# Altium footprint library Dr.Xiong_20160818.PcbLib: 266 footprints (part 9 of 17)
Each footprint in its own frame and in the unit in brackets; x right, y up, seen from the top. Pads: shape width x height; smd on the part's side, far side on the other; paste and mask are expansions set on the pad; w line width, h text height; cw(c..) or ccw(c..) is an arc to the next point about the centre after c.
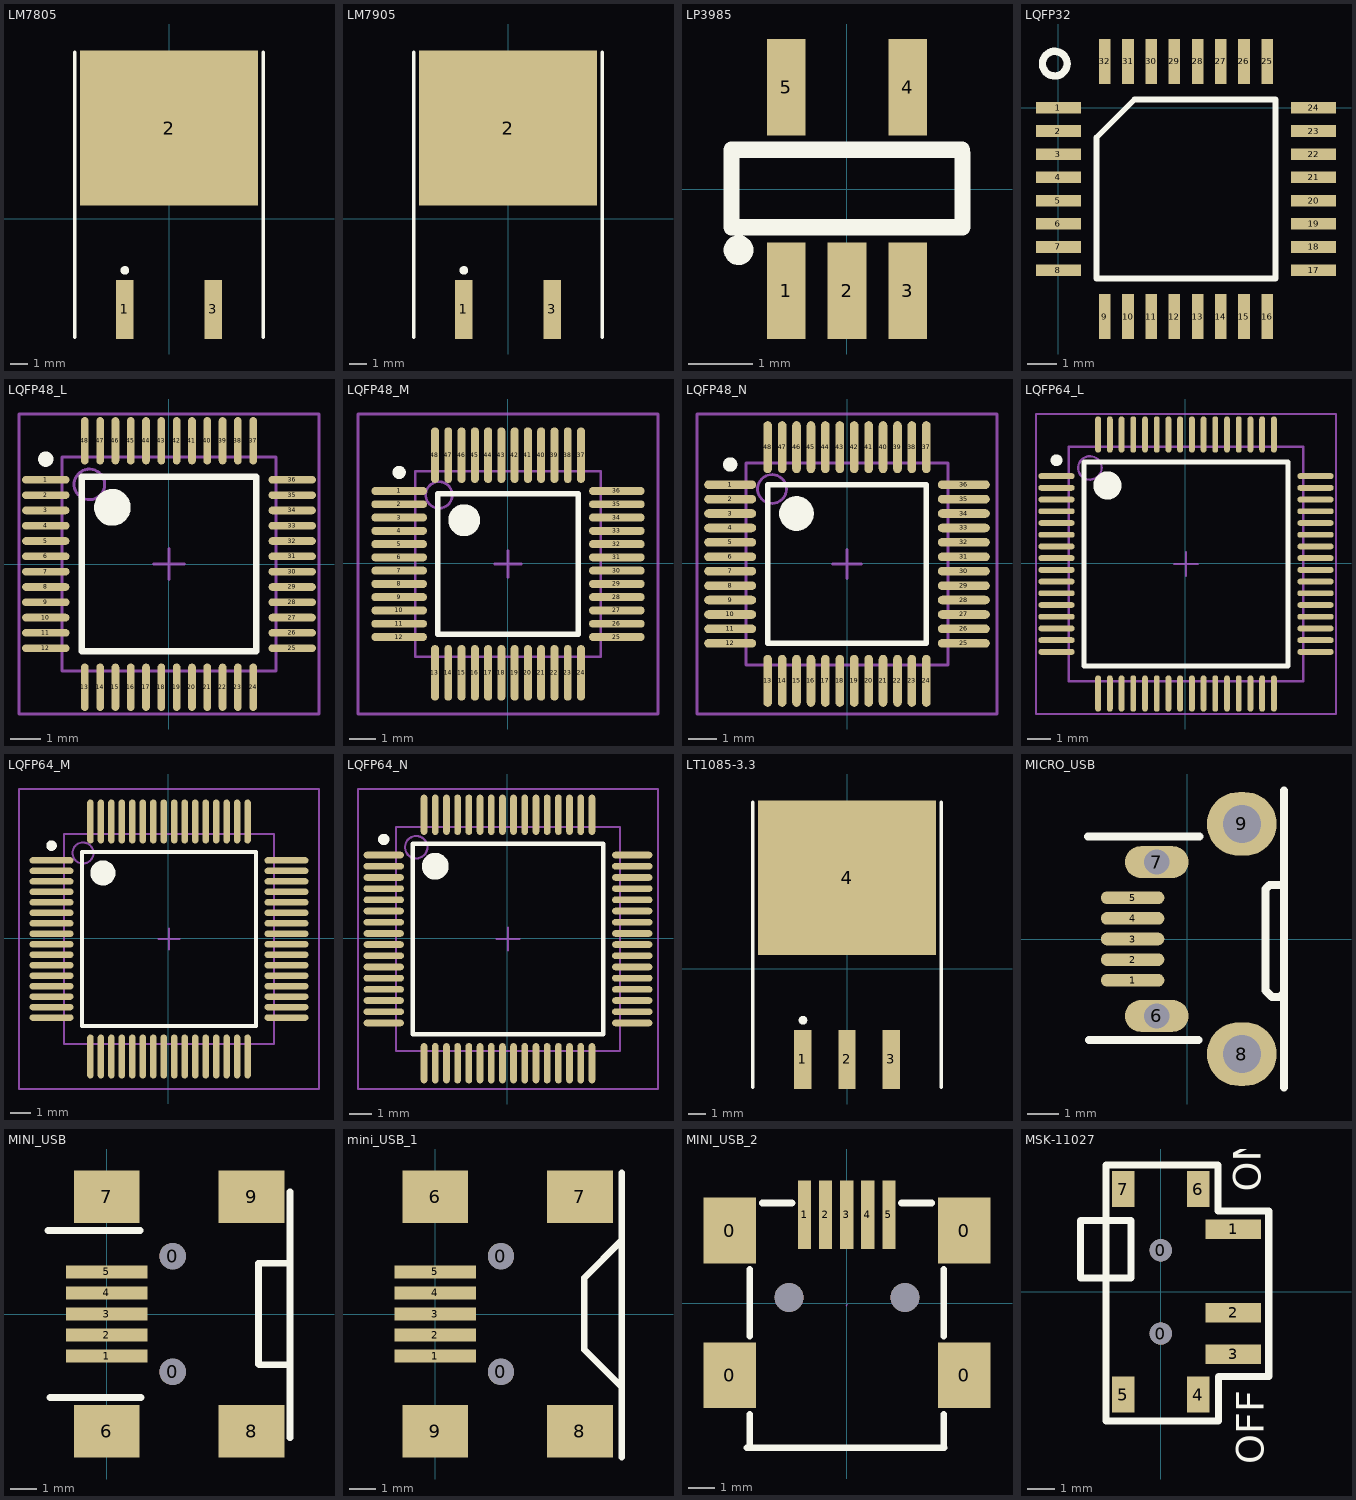
[diagram p8: the footprints below, top view; thin cyan lines are the x and y axes]

## LM7805 [mm]
pads (3):
  rect 1x3.4 smd: 1(-2.54,-5.225) 3(2.54,-5.225)
  rect 10.25x8.9 smd: 2(0,5.225)
Top Overlay:
  circle w0.25: c-2.54,-2.975 r0.125
  lines w0.2: -5.425,-6.825 -5.425,9.575 ; 5.425,-6.825 5.425,9.575

## LM7905 [mm]
pads (3):
  rect 1x3.4 smd: 1(-2.54,-5.225) 3(2.54,-5.225)
  rect 10.25x8.9 smd: 2(0,5.225)
Top Overlay:
  circle w0.25: c-2.54,-2.975 r0.125
  lines w0.2: -5.425,-6.825 -5.425,9.575 ; 5.425,-6.825 5.425,9.575

## LP3985 [mm]
pads (5):
  rect 0.6x1.5 smd: 1(-0.95,-1.587) 2(0,-1.587) 3(0.95,-1.587) 4(0.95,1.587) 5(-0.95,1.587)
Top Overlay:
  circle w0.254: c-1.69,-0.953 r0.105
  lines w0.254: 1.742,0.61 1.8,0.553 1.8,-0.597 -1.8,-0.597 -1.8,0.61 1.793,0.61

## LQFP32 [mm]
pads (32):
  rect 1.55x0.4 smd: 1(0,0) 2(0,-0.8) 3(0,-1.6) 4(0,-2.4) 5(0,-3.2) 6(0,-4) 7(0,-4.8) 8(0,-5.6) 17(8.8,-5.6) 18(8.8,-4.8) 19(8.8,-4) 20(8.8,-3.2) 21(8.8,-2.4) 22(8.8,-1.6) 23(8.8,-0.8) 24(8.8,0)
  rect 0.4x1.55 smd: 9(1.6,-7.2) 10(2.4,-7.2) 11(3.2,-7.2) 12(4,-7.2) 13(4.8,-7.2) 14(5.6,-7.2) 15(6.4,-7.2) 16(7.2,-7.2) 25(7.2,1.6) 26(6.4,1.6) 27(5.6,1.6) 28(4.8,1.6) 29(4,1.6) 30(3.2,1.6) 31(2.4,1.6) 32(1.6,1.6)
Top Overlay:
  circle w0.254: c-0.127,1.524 r0.426
  lines w0.2: 1.31,-5.89 7.49,-5.89 7.49,0.29 2.62,0.29 1.31,-1.02 1.31,-5.89

## LQFP48_L [mm]
pads (48):
  oval 1.55x0.25 smd: 1(-4.025,2.75) 2(-4.025,2.25) 3(-4.025,1.75) 4(-4.025,1.25) 5(-4.025,0.75) 6(-4.025,0.25) 7(-4.025,-0.25) 8(-4.025,-0.75) 9(-4.025,-1.25) 10(-4.025,-1.75) 11(-4.025,-2.25) 12(-4.025,-2.75) 25(4.025,-2.75) 26(4.025,-2.25) 27(4.025,-1.75) 28(4.025,-1.25) 29(4.025,-0.75) 30(4.025,-0.25) 31(4.025,0.25) 32(4.025,0.75) 33(4.025,1.25) 34(4.025,1.75) 35(4.025,2.25) 36(4.025,2.75)
  oval 0.25x1.55 smd: 13(-2.75,-4.025) 14(-2.25,-4.025) 15(-1.75,-4.025) 16(-1.25,-4.025) 17(-0.75,-4.025) 18(-0.25,-4.025) 19(0.25,-4.025) 20(0.75,-4.025) 21(1.25,-4.025) 22(1.75,-4.025) 23(2.25,-4.025) 24(2.75,-4.025) 37(2.75,4.025) 38(2.25,4.025) 39(1.75,4.025) 40(1.25,4.025) 41(0.75,4.025) 42(0.25,4.025) 43(-0.25,4.025) 44(-0.75,4.025) 45(-1.25,4.025) 46(-1.75,4.025) 47(-2.25,4.025) 48(-2.75,4.025)
Top Overlay:
  circle w0.25: c-4.025,3.425 r0.125
  circle w0.6: c-1.85,1.85 r0.3
  lines w0.2: -2.85,-2.85 -2.85,2.85 2.85,2.85 2.85,-2.85 -2.85,-2.85
Mechanical 13:
  circle w0.1: c-2.6,2.6 r0.5
  lines w0.1: -3.5,-3.5 -3.5,3.5 3.5,3.5 3.5,-3.5 -3.5,-3.5
Mechanical 15:
  lines w0.1: -0.5,0 0.5,0 ; 0,-0.5 0,0.5 ; -4.9,-4.9 -4.9,4.9 4.9,4.9 4.9,-4.9 -4.9,-4.9

## LQFP48_M [mm]
pads (48):
  oval 2.1x0.3 smd: 1(-4.1,2.725) 2(-4.1,2.225) 3(-4.1,1.725) 4(-4.1,1.225) 5(-4.1,0.725) 6(-4.1,0.225) 7(-4.1,-0.275) 8(-4.1,-0.775) 9(-4.1,-1.275) 10(-4.1,-1.775) 11(-4.1,-2.275) 12(-4.1,-2.775) 25(4.1,-2.775) 26(4.1,-2.275) 27(4.1,-1.775) 28(4.1,-1.275) 29(4.1,-0.775) 30(4.1,-0.275) 31(4.1,0.225) 32(4.1,0.725) 33(4.1,1.225) 34(4.1,1.725) 35(4.1,2.225) 36(4.1,2.725)
  oval 0.3x2.1 smd: 13(-2.75,-4.125) 14(-2.25,-4.125) 15(-1.75,-4.125) 16(-1.25,-4.125) 17(-0.75,-4.125) 18(-0.25,-4.125) 19(0.25,-4.125) 20(0.75,-4.125) 21(1.25,-4.125) 22(1.75,-4.125) 23(2.25,-4.125) 24(2.75,-4.125) 37(2.75,4.075) 38(2.25,4.075) 39(1.75,4.075) 40(1.25,4.075) 41(0.75,4.075) 42(0.25,4.075) 43(-0.25,4.075) 44(-0.75,4.075) 45(-1.25,4.075) 46(-1.75,4.075) 47(-2.25,4.075) 48(-2.75,4.075)
Top Overlay:
  circle w0.25: c-4.1,3.425 r0.125
  circle w0.6: c-1.65,1.625 r0.3
  lines w0.2: -2.65,-2.675 -2.65,2.625 2.65,2.625 2.65,-2.675 -2.65,-2.675
Mechanical 13:
  circle w0.1: c-2.6,2.575 r0.5
  lines w0.1: -3.5,-3.525 -3.5,3.475 3.5,3.475 3.5,-3.525 -3.5,-3.525
Mechanical 15:
  lines w0.1: -0.5,-0.025 0.5,-0.025 ; 0,-0.525 0,0.475 ; -5.65,-5.675 -5.65,5.625 5.65,5.625 5.65,-5.675 -5.65,-5.675

## LQFP48_N [mm]
pads (48):
  oval 1.8x0.3 smd: 1(-4.05,2.725) 2(-4.05,2.225) 3(-4.05,1.725) 4(-4.05,1.225) 5(-4.05,0.725) 6(-4.05,0.225) 7(-4.05,-0.275) 8(-4.05,-0.775) 9(-4.05,-1.275) 10(-4.05,-1.775) 11(-4.05,-2.275) 12(-4.05,-2.775) 25(4.05,-2.775) 26(4.05,-2.275) 27(4.05,-1.775) 28(4.05,-1.275) 29(4.05,-0.775) 30(4.05,-0.275) 31(4.05,0.225) 32(4.05,0.725) 33(4.05,1.225) 34(4.05,1.725) 35(4.05,2.225) 36(4.05,2.725)
  oval 0.3x1.8 smd: 13(-2.75,-4.075) 14(-2.25,-4.075) 15(-1.75,-4.075) 16(-1.25,-4.075) 17(-0.75,-4.075) 18(-0.25,-4.075) 19(0.25,-4.075) 20(0.75,-4.075) 21(1.25,-4.075) 22(1.75,-4.075) 23(2.25,-4.075) 24(2.75,-4.075) 37(2.75,4.025) 38(2.25,4.025) 39(1.75,4.025) 40(1.25,4.025) 41(0.75,4.025) 42(0.25,4.025) 43(-0.25,4.025) 44(-0.75,4.025) 45(-1.25,4.025) 46(-1.75,4.025) 47(-2.25,4.025) 48(-2.75,4.025)
Top Overlay:
  circle w0.6: c-1.75,1.725 r0.3
  circle w0.25: c-4.05,3.425 r0.125
  lines w0.2: -2.75,-2.775 2.75,-2.775 2.75,2.725 -2.75,2.725 -2.75,-2.775
Mechanical 13:
  circle w0.1: c-2.6,2.575 r0.5
  lines w0.1: -3.5,-3.525 3.5,-3.525 3.5,3.475 -3.5,3.475 -3.5,-3.525
Mechanical 15:
  lines w0.1: -0.5,-0.025 0.5,-0.025 ; 0,-0.525 0,0.475 ; -5.2,-5.225 5.2,-5.225 5.2,5.175 -5.2,5.175 -5.2,-5.225

## LQFP64_L [mm]
pads (64):
  oval 1.55x0.25 smd: 1(-5.5,3.725) 2(-5.5,3.225) 3(-5.5,2.725) 4(-5.5,2.225) 5(-5.5,1.725) 6(-5.5,1.225) 7(-5.5,0.725) 8(-5.5,0.225) 9(-5.5,-0.275) 10(-5.5,-0.775) 11(-5.5,-1.275) 12(-5.5,-1.775) 13(-5.5,-2.275) 14(-5.5,-2.775) 15(-5.5,-3.275) 16(-5.5,-3.775) 33(5.55,-3.775) 34(5.55,-3.275) 35(5.55,-2.775) 36(5.55,-2.275) 37(5.55,-1.775) 38(5.55,-1.275) 39(5.55,-0.775) 40(5.55,-0.275) 41(5.55,0.225) 42(5.55,0.725) 43(5.55,1.225) 44(5.55,1.725) 45(5.55,2.225) 46(5.55,2.725) 47(5.55,3.225) 48(5.55,3.725)
  oval 0.25x1.55 smd: 17(-3.725,-5.55) 18(-3.225,-5.55) 19(-2.725,-5.55) 20(-2.225,-5.55) 21(-1.725,-5.55) 22(-1.225,-5.55) 23(-0.725,-5.55) 24(-0.225,-5.55) 25(0.275,-5.55) 26(0.775,-5.55) 27(1.275,-5.55) 28(1.775,-5.55) 29(2.275,-5.55) 30(2.775,-5.55) 31(3.275,-5.55) 32(3.775,-5.55) 49(3.775,5.5) 50(3.275,5.5) 51(2.775,5.5) 52(2.275,5.5) 53(1.775,5.5) 54(1.275,5.5) 55(0.775,5.5) 56(0.275,5.5) 57(-0.225,5.5) 58(-0.725,5.5) 59(-1.225,5.5) 60(-1.725,5.5) 61(-2.225,5.5) 62(-2.725,5.5) 63(-3.225,5.5) 64(-3.725,5.5)
Top Overlay:
  circle w0.25: c-5.5,4.4 r0.125
  circle w0.6: c-3.325,3.325 r0.3
  lines w0.2: -4.325,-4.375 -4.325,4.325 4.375,4.325 4.375,-4.375 -4.325,-4.375
Mechanical 13:
  circle w0.1: c-4.075,4.075 r0.5
  lines w0.1: -4.975,-5.025 -4.975,4.975 5.025,4.975 5.025,-5.025 -4.975,-5.025
Mechanical 15:
  lines w0.1: -0.475,-0.025 0.525,-0.025 ; 0.025,-0.525 0.025,0.475 ; -6.375,-6.425 -6.375,6.375 6.425,6.375 6.425,-6.425 -6.375,-6.425

## LQFP64_M [mm]
pads (64):
  oval 2.1x0.3 smd: 1(-5.575,3.725) 2(-5.575,3.225) 3(-5.575,2.725) 4(-5.575,2.225) 5(-5.575,1.725) 6(-5.575,1.225) 7(-5.575,0.725) 8(-5.575,0.225) 9(-5.575,-0.275) 10(-5.575,-0.775) 11(-5.575,-1.275) 12(-5.575,-1.775) 13(-5.575,-2.275) 14(-5.575,-2.775) 15(-5.575,-3.275) 16(-5.575,-3.775) 33(5.625,-3.775) 34(5.625,-3.275) 35(5.625,-2.775) 36(5.625,-2.275) 37(5.625,-1.775) 38(5.625,-1.275) 39(5.625,-0.775) 40(5.625,-0.275) 41(5.625,0.225) 42(5.625,0.725) 43(5.625,1.225) 44(5.625,1.725) 45(5.625,2.225) 46(5.625,2.725) 47(5.625,3.225) 48(5.625,3.725)
  oval 0.3x2.1 smd: 17(-3.725,-5.625) 18(-3.225,-5.625) 19(-2.725,-5.625) 20(-2.225,-5.625) 21(-1.725,-5.625) 22(-1.225,-5.625) 23(-0.725,-5.625) 24(-0.225,-5.625) 25(0.275,-5.625) 26(0.775,-5.625) 27(1.275,-5.625) 28(1.775,-5.625) 29(2.275,-5.625) 30(2.775,-5.625) 31(3.275,-5.625) 32(3.775,-5.625) 49(3.775,5.575) 50(3.275,5.575) 51(2.775,5.575) 52(2.275,5.575) 53(1.775,5.575) 54(1.275,5.575) 55(0.775,5.575) 56(0.275,5.575) 57(-0.225,5.575) 58(-0.725,5.575) 59(-1.225,5.575) 60(-1.725,5.575) 61(-2.225,5.575) 62(-2.725,5.575) 63(-3.225,5.575) 64(-3.725,5.575)
Top Overlay:
  circle w0.6: c-3.125,3.125 r0.3
  circle w0.25: c-5.575,4.425 r0.125
  lines w0.2: -4.125,-4.175 4.175,-4.175 4.175,4.125 -4.125,4.125 -4.125,-4.175
Mechanical 13:
  circle w0.1: c-4.075,4.075 r0.5
  lines w0.1: -4.975,-5.025 5.025,-5.025 5.025,4.975 -4.975,4.975 -4.975,-5.025
Mechanical 15:
  lines w0.1: -0.475,-0.025 0.525,-0.025 ; 0.025,-0.525 0.025,0.475 ; -7.125,-7.175 7.175,-7.175 7.175,7.125 -7.125,7.125 -7.125,-7.175

## LQFP64_N [mm]
pads (64):
  oval 1.8x0.3 smd: 1(-5.525,3.725) 2(-5.525,3.225) 3(-5.525,2.725) 4(-5.525,2.225) 5(-5.525,1.725) 6(-5.525,1.225) 7(-5.525,0.725) 8(-5.525,0.225) 9(-5.525,-0.275) 10(-5.525,-0.775) 11(-5.525,-1.275) 12(-5.525,-1.775) 13(-5.525,-2.275) 14(-5.525,-2.775) 15(-5.525,-3.275) 16(-5.525,-3.775) 33(5.575,-3.775) 34(5.575,-3.275) 35(5.575,-2.775) 36(5.575,-2.275) 37(5.575,-1.775) 38(5.575,-1.275) 39(5.575,-0.775) 40(5.575,-0.275) 41(5.575,0.225) 42(5.575,0.725) 43(5.575,1.225) 44(5.575,1.725) 45(5.575,2.225) 46(5.575,2.725) 47(5.575,3.225) 48(5.575,3.725)
  oval 0.3x1.8 smd: 17(-3.725,-5.575) 18(-3.225,-5.575) 19(-2.725,-5.575) 20(-2.225,-5.575) 21(-1.725,-5.575) 22(-1.225,-5.575) 23(-0.725,-5.575) 24(-0.225,-5.575) 25(0.275,-5.575) 26(0.775,-5.575) 27(1.275,-5.575) 28(1.775,-5.575) 29(2.275,-5.575) 30(2.775,-5.575) 31(3.275,-5.575) 32(3.775,-5.575) 49(3.775,5.525) 50(3.275,5.525) 51(2.775,5.525) 52(2.275,5.525) 53(1.775,5.525) 54(1.275,5.525) 55(0.775,5.525) 56(0.275,5.525) 57(-0.225,5.525) 58(-0.725,5.525) 59(-1.225,5.525) 60(-1.725,5.525) 61(-2.225,5.525) 62(-2.725,5.525) 63(-3.225,5.525) 64(-3.725,5.525)
Top Overlay:
  circle w0.25: c-5.525,4.425 r0.125
  circle w0.6: c-3.225,3.225 r0.3
  lines w0.2: -4.225,-4.275 -4.225,4.225 4.275,4.225 4.275,-4.275 -4.225,-4.275
Mechanical 13:
  circle w0.1: c-4.075,4.075 r0.5
  lines w0.1: -4.975,-5.025 -4.975,4.975 5.025,4.975 5.025,-5.025 -4.975,-5.025
Mechanical 15:
  lines w0.1: -0.475,-0.025 0.525,-0.025 ; 0.025,-0.525 0.025,0.475 ; -6.675,-6.725 -6.675,6.675 6.725,6.675 6.725,-6.725 -6.675,-6.725

## LT1085-3.3 [mm]
pads (4):
  rect 1x3.4 smd: 1(-2.54,-5.219) 2(0,-5.231) 3(2.54,-5.219)
  rect 10.25x8.9 smd: 4(0,5.231)
Top Overlay:
  circle w0.25: c-2.54,-2.969 r0.125
  lines w0.2: -5.425,-6.819 -5.425,9.581 ; 5.425,-6.819 5.425,9.581

## MICRO_USB [mm]
pads (9):
  oval 2x0.4 smd: 1(-1.72,-1.3) 2(-1.72,-0.65) 3(-1.72,0) 4(-1.72,0.65) 5(-1.72,1.3)
  oval 2x1 hole 0.8: 6(-0.96,-2.425) 7(-0.96,2.425)
  oval 2.2x2 hole 1.2: 8(1.72,-3.625) 9(1.72,3.625)
Top Overlay:
  lines w0.254: -3.124,3.226 0.381,3.226 ; -3.099,-3.175 0.356,-3.175 ; 2.997,1.702 2.591,1.702 2.464,1.575 2.464,-1.626 2.667,-1.829 2.921,-1.829 3.048,-1.702 ; 3.048,-4.674 3.048,4.674

## MINI_USB [mm]
pads (11):
  round 1 hole 1: 0(2.5,-2.2) 0(2.5,2.2)
  rect 3.1x0.5 smd: 1(0,-1.6) 2(0,-0.8) 3(0,0) 4(0,0.8) 5(0,1.6)
  rect 2.5x2 smd: 6(0,-4.45) 7(0,4.45) 8(5.5,-4.45) 9(5.5,4.45)
Top Overlay:
  lines w0.254: -2.235,3.175 1.27,3.175 ; -2.159,-3.175 1.295,-3.175 ; 6.883,1.93 5.766,1.93 5.766,-1.905 5.791,-1.93 6.96,-1.93 ; 6.96,-4.699 6.96,4.648

## mini_USB_1 [mm]
pads (11):
  round 1 hole 1: 0(2.5,-2.2) 0(2.5,2.2)
  rect 3.1x0.5 smd: 1(0,-1.6) 2(0,-0.8) 3(0,0) 4(0,0.8) 5(0,1.6)
  rect 2.5x2 smd: 6(0,4.45) 7(5.5,4.45) 8(5.5,-4.45) 9(0,-4.45)
Top Overlay:
  lines w0.254: 7.061,-2.743 5.664,-1.346 5.664,1.372 7.087,2.794 7.087,2.87 ; 7.087,-5.436 7.087,5.359

## MINI_USB_2 [mil]
pads (11):
  rect 78.8x98.5 smd: 0(-174.6,-107.97) 0(175.8,-107.97)
  rect 78.8x98.4 smd: 0(-174.6,108.58)
  rect 78.7x98.4 smd: 0(175.75,108.58)
  rect 19.6x102.4 smd: 1(-62.8,132.48) 2(-31.3,132.48) 3(0.2,132.48) 4(31.7,132.48) 5(63.2,132.48)
  round 43.31 hole 43.31 unplated: ""(-86,8.58) ""(87.2,8.58)
Top Overlay:
  lines w10: -149,-216.22 146.3,-216.22 ; -145.1,-215.82 -145.1,-166.32 ; -145.1,-49.62 -145.1,50.28 ; -126.1,149.76 -81.7,149.76 ; 82.1,149.76 127.3,149.76 ; 145.59,-216.22 145.59,-166.32 ; 145.59,-49.62 145.59,50.28
Mechanical 15:
  lines w0.1: -0.4,-3.89 1.6,-1.89

## MSK-11027 [mm]
pads (9):
  round 0.8 hole 0.8: 0(0,-1.5) 0(0,1.5)
  rect 2x0.7 smd: 1(2.6,2.25) 2(2.6,-0.75) 3(2.6,-2.25)
  rect 0.8x1.3 smd: 4(1.35,-3.7) 5(-1.35,-3.7) 6(1.35,3.7) 7(-1.35,3.7)
Top Overlay:
  lines w0.254: -2.057,2.565 -1.067,2.565 -1.067,2.515 -1.067,0.508 -2.896,0.508 -2.896,2.565 -2.007,2.565 ; -1.981,3.556 -1.981,4.572 2.057,4.572 2.057,2.921 2.134,2.921 3.886,2.921 3.886,-3.048 2.083,-3.048 2.083,-4.648 -1.981,-4.648 -1.981,4.496
  text "OFF" at 3.708,-6.198 h1
  text "ON" at 3.607,3.607 h1